# Altium schematic symbol library Analog Devices Data Converters Analog-to-Digital Converters.SchLib: 2404 symbols (part 177 of 213)
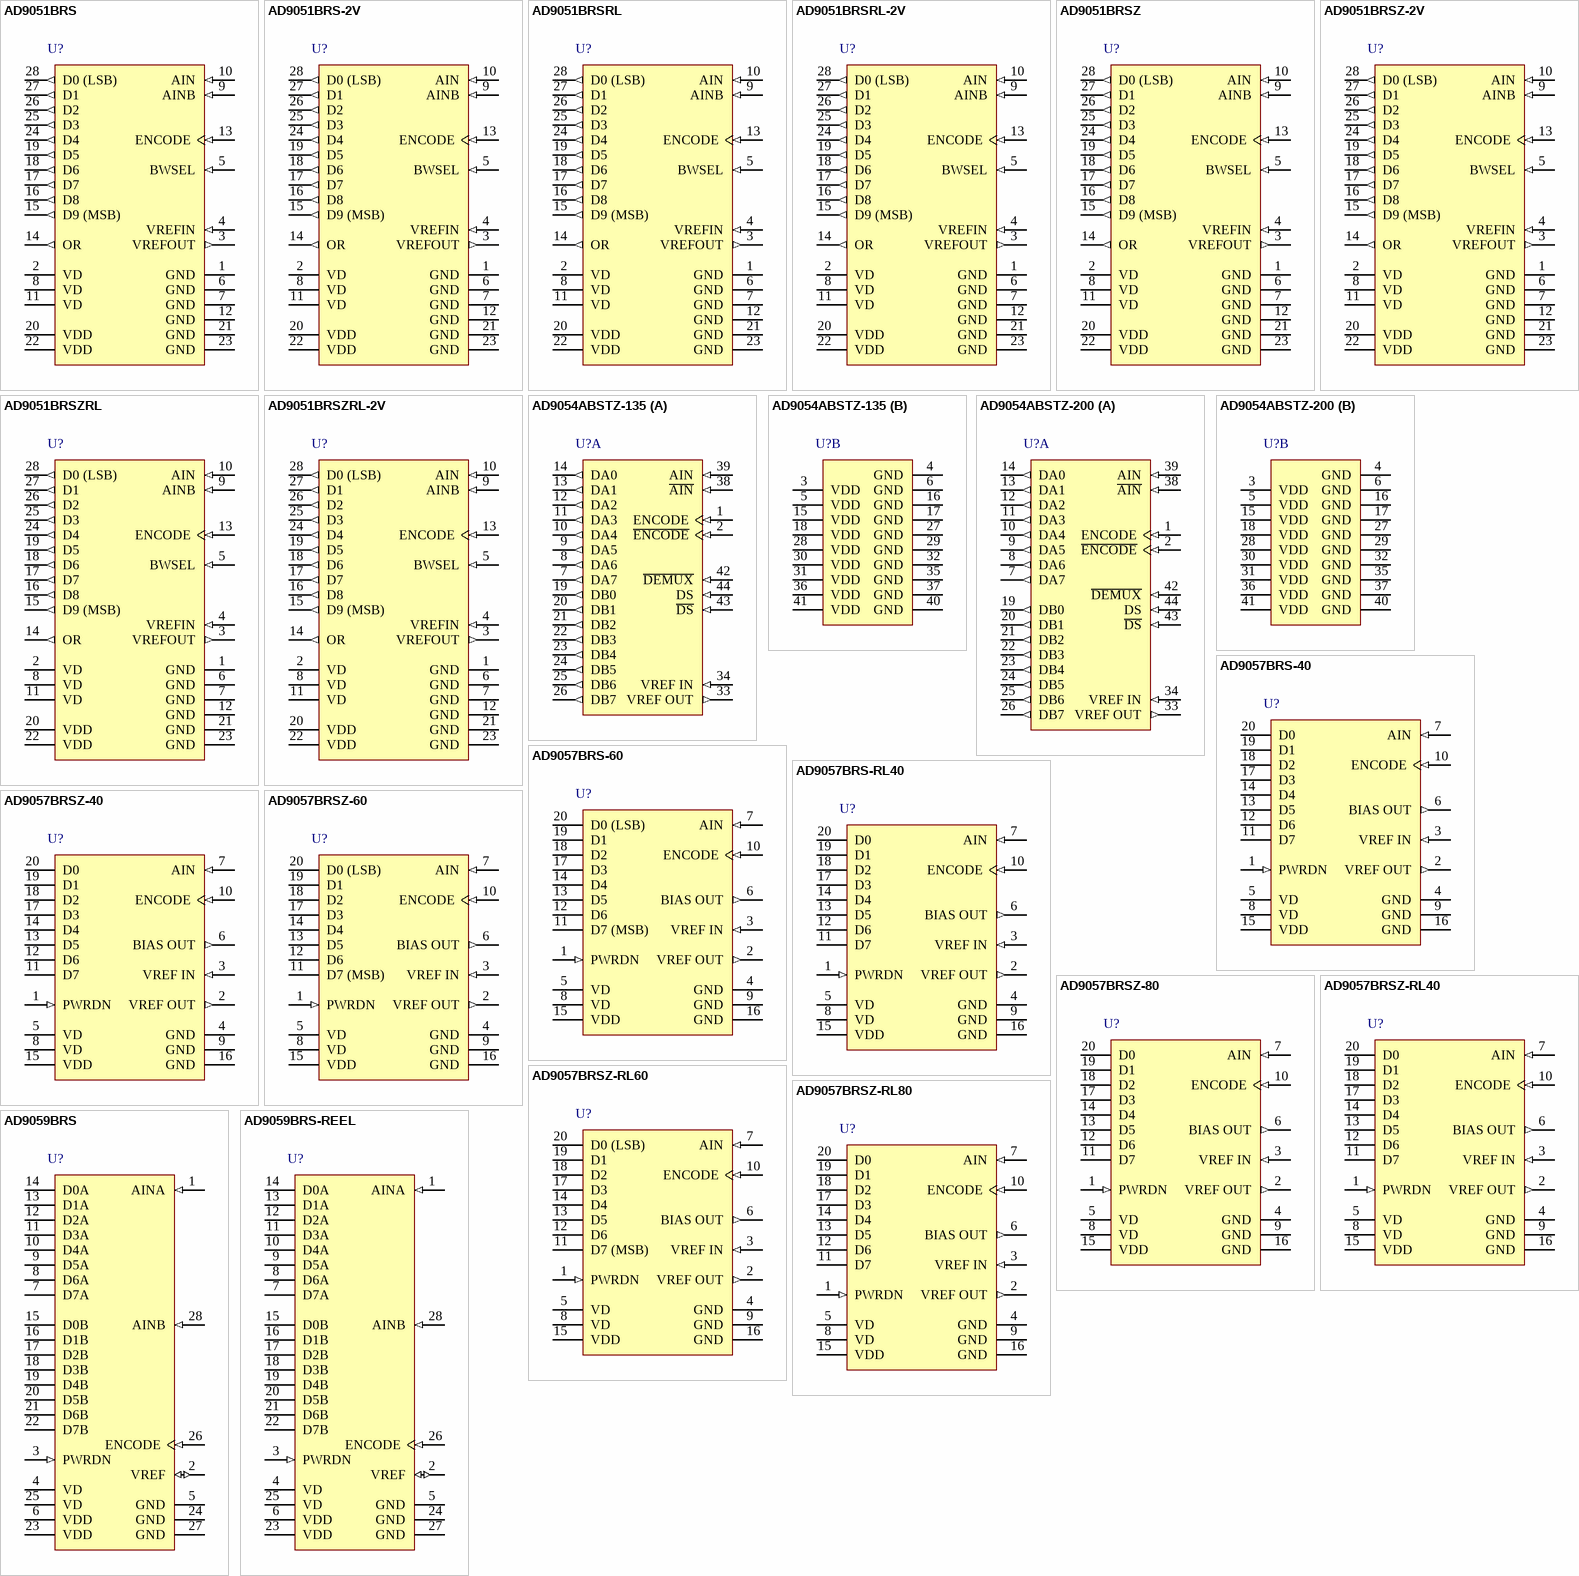
[diagram p332: symbols AD9051BRS to AD9059BRS-REEL]

## AD9051BRSZRL-2V
designator U?
Single 10-Bit Analog-to-Digital Converter with Parallel Interface, 60MSPS, -40 to +85 degC, RS-28, Pb-Free, Reel; Generic Part Number: AD9051; Manufacturer: Analog Devices; PartNumber: AD9051BRSZRL-2V; Resolution (Bits): 10; Channels: 1; Throughput Rate (SPS): 60M; Interface: Par; DatasheetVersion: Rev.C; PackageVersion: 060106-A; PackageReference: RS-28; PackageDescription: 28-Lead Shrink Small Outline Package [SSOP]; Supplier 1: Digi-Key; Supplier Part Number 1: AD9051BRSZRL-2V-ND; Supplier 2: Mouser; Supplier Part Number 2: 584-AD9051BRSZR-2V; RoHS: Y; Packing: Reel; Mounting Technology: Surface Mount; Code_JEDEC: MO-150-AH; ComponentLink1Description: Manufacturer URL; ComponentLink1URL: http://www.analog.com/en/index.html; ComponentLink2Description: Datasheet; ComponentLink2URL: http://www.analog.com/static/imported-files/data_sheets/AD9051.pdf; ComponentLink3Description: Package Specification; ComponentLink3URL: http://www.analog.com/static/imported-files/packages/32122249223724RS_28.pdf; ComponentLink4Description: Product URL; ComponentLink4URL: http://www.analog.com/en/analog-to-digital-converters/ad-converters/ad9051/products/product.html
footprint RS-28_N (SOP, 28-Leads, Body 10.2x5.3mm, Pitch 0.65mm, IPC Medium Density)
footprint RS-28_L (SOP, 28-Leads, Body 10.2x5.3mm, Pitch 0.65mm, IPC High Density)
footprint RS-28_M (SOP, 28-Leads, Body 10.2x5.3mm, Pitch 0.65mm, IPC Low Density)
pins: 1 GND (power) "Ground", 2 VD (power) "Analog 5 V Power Supply", 3 VREFOUT (out) "Internal Bandgap Voltage Reference (Nominally 2.5 V)", 4 VREFIN (in) "Input to Reference Amplifier. Voltage reference for ADC is connected here.", 5 BWSEL (in) "Bandwidth Select. NC = 130 MHz nominal. +VD = 50 MHz nominal.", 6 GND (power) "Ground", 7 GND (power) "Ground", 8 VD (power) "Analog 5 V Power Supply", 9 AINB (in) "Complementary Analog Input Pin (Analog Input Bar)", 10 AIN (in) "Analog Input Pin", 11 VD (power) "Analog 5 V Power Supply", 12 GND (power) "Ground", 13 ENCODE (in) "Encode Clock Input to ADC. Internal T/H is placed in hold mode (ADC is encoding) on rising edge of encode signal.", 14 OR (out) "Out of Range Signal. Logic 0 when analog input is in nominal range. Logic 1 when analog input is out of nominal range", 15 D9 (MSB) (out) "Most Significant Bit of ADC Output", 16 D8 (out) "Digital Output Bits of ADC", 17 D7 (out) "Digital Output Bits of ADC", 18 D6 (out) "Digital Output Bits of ADC", 19 D5 (out) "Digital Output Bits of ADC", 20 VDD (power) "Digital Output Power Supply (Only Used by Digital Outputs)", 21 GND (power) "Ground", 22 VDD (power) "Digital Output Power Supply (Only Used by Digital Outputs)", 23 GND (power) "Ground", 24 D4 (out) "Digital Output Bits of ADC", 25 D3 (out) "Digital Output Bits of ADC", 26 D2 (out) "Digital Output Bits of ADC", 27 D1 (out) "Digital Output Bits of ADC", 28 D0 (LSB) (out) "Least Significant Bit of ADC Output"

## AD9054ABSTZ-135
designator U?
Single 8-Bit Analog-to-Digital Converter with Parallel Interface, 135MSPS, -40 to +85 degC, ST-44-1, Pb-Free, Tray; Generic Part Number: AD9054A-135; Manufacturer: Analog Devices; PartNumber: AD9054ABSTZ-135; Resolution (Bits): 8; Channels: 1; Throughput Rate (SPS): 135M; Interface: Par; DatasheetVersion: Rev.D; PackageVersion: 051706-A; PackageReference: ST-44-1; PackageDescription: 44-Lead Low Profile Quad Flat Package [LQFP]; Supplier 1: Digi-Key; Supplier Part Number 1: AD9054ABSTZ-135-ND; Supplier 2: Mouser; Supplier Part Number 2: 584-AD9054ABSTZ-135; RoHS: Y; Packing: Tray; Mounting Technology: Surface Mount; ComponentLink1Description: Manufacturer URL; ComponentLink1URL: http://www.analog.com/en/index.html; ComponentLink2Description: Datasheet; ComponentLink2URL: http://www.analog.com/static/imported-files/data_sheets/AD9054A.pdf; ComponentLink3Description: Package Specification; ComponentLink3URL: http://www.analog.com/static/imported-files/packages/52366619645036ST_44_1.pdf; ComponentLink4Description: Product URL; ComponentLink4URL: http://www.analog.com/en/analog-to-digital-converters/ad-converters/ad9054a/products/product.html
footprint ST-44-1_N (Thin QFP, 44-Leads, Body 10x10mm, Pitch 0.8mm, IPC Medium Density)
footprint ST-44-1_L (Thin QFP, 44-Leads, Body 10x10mm, Pitch 0.8mm, IPC High Density)
footprint ST-44-1_M (Thin QFP, 44-Leads, Body 10x10mm, Pitch 0.8mm, IPC Low Density)
part A pins: 1 ENCODE (in) "Encode Clock for ADC (ADC Samples on Rising Edge of ENCODE)", 2 ~{ENCODE} (in) "Encode Clock Complement (ADC Samples on Falling Edge of E\N\C\O\D\E\)", 7 DA7 (out) "Digital Outputs of ADC Channel A. DA7 is the MSB, DA0 the LSB", 8 DA6 (out) "Digital Outputs of ADC Channel A. DA7 is the MSB, DA0 the LSB", 9 DA5 (out) "Digital Outputs of ADC Channel A. DA7 is the MSB, DA0 the LSB", 10 DA4 (out) "Digital Outputs of ADC Channel A. DA7 is the MSB, DA0 the LSB", 11 DA3 (out) "Digital Outputs of ADC Channel A. DA7 is the MSB, DA0 the LSB", 12 DA2 (out) "Digital Outputs of ADC Channel A. DA7 is the MSB, DA0 the LSB", 13 DA1 (out) "Digital Outputs of ADC Channel A. DA7 is the MSB, DA0 the LSB", 14 DA0 (out) "Digital Outputs of ADC Channel A. DA7 is the MSB, DA0 the LSB", 19 DB0 (out) "Digital Outputs of ADC Channel B. DB7 is the MSB, DB0 the LSB", 20 DB1 (out) "Digital Outputs of ADC Channel B. DB7 is the MSB, DB0 the LSB", 21 DB2 (out) "Digital Outputs of ADC Channel B. DB7 is the MSB, DB0 the LSB", 22 DB3 (out) "Digital Outputs of ADC Channel B. DB7 is the MSB, DB0 the LSB", 23 DB4 (out) "Digital Outputs of ADC Channel B. DB7 is the MSB, DB0 the LSB", 24 DB5 (out) "Digital Outputs of ADC Channel B. DB7 is the MSB, DB0 the LSB", 25 DB6 (out) "Digital Outputs of ADC Channel B. DB7 is the MSB, DB0 the LSB", 26 DB7 (out) "Digital Outputs of ADC Channel B. DB7 is the MSB, DB0 the LSB", 33 VREF OUT (out) "Internal Reference Output (2.5 V typical); Bypass with 0.1 uF to Ground", 34 VREF IN (in) "Reference Input for ADC (2.5 V typical, +/-4%)", 38 ~{AIN} (in) "Analog Input--Complement. Connect to input signal midscale reference.", 39 AIN (in) "Analog Input--True", 42 ~{DEMUX} (in) "Format Select. LOW = Dual. Channel Mode, HIGH = Single. Channel Mode (Channel A Only)", 43 ~{DS} (in) "Data Sync Complement", 44 DS (in) "Data Sync--Aligns Output Channels in Dual-Channel Mode"
part B pins: 3 VDD (power) "Power Supply (5 V)", 4 GND (power) "Ground", 5 VDD (power) "Power Supply (5 V)", 6 GND (power) "Ground", 15 VDD (power) "Power Supply (5 V)", 16 GND (power) "Ground", 17 GND (power) "Ground", 18 VDD (power) "Power Supply (5 V)", 27 GND (power) "Ground", 28 VDD (power) "Power Supply (5 V)", 29 GND (power) "Ground", 30 VDD (power) "Power Supply (5 V)", 31 VDD (power) "Power Supply (5 V)", 32 GND (power) "Ground", 35 GND (power) "Ground", 36 VDD (power) "Power Supply (5 V)", 37 GND (power) "Ground", 40 GND (power) "Ground", 41 VDD (power) "Power Supply (5 V)"

## AD9054ABSTZ-200
designator U?
Single 8-Bit Analog-to-Digital Converter with Parallel Interface, 200MSPS, -40 to +85 degC, ST-44-1, Pb-Free, Tray; Generic Part Number: AD9054A-200; Manufacturer: Analog Devices; PartNumber: AD9054ABSTZ-200; Resolution (Bits): 8; Channels: 1; Throughput Rate (SPS): 200M; Interface: Par; DatasheetVersion: Rev.D; PackageVersion: 051706-A; PackageReference: ST-44-1; PackageDescription: 44-Lead Low Profile Quad Flat Package [LQFP]; Supplier 1: Digi-Key; Supplier Part Number 1: AD9054ABSTZ-200-ND; Supplier 2: Newark; Supplier Part Number 2: 12M9172; Supplier 3: Mouser; Supplier Part Number 3: 584-AD9054ABSTZ-200; RoHS: Y; Packing: Tray; Mounting Technology: Surface Mount; ComponentLink1Description: Manufacturer URL; ComponentLink1URL: http://www.analog.com/en/index.html; ComponentLink2Description: Datasheet; ComponentLink2URL: http://www.analog.com/static/imported-files/data_sheets/AD9054A.pdf; ComponentLink3Description: Package Specification; ComponentLink3URL: http://www.analog.com/static/imported-files/packages/52366619645036ST_44_1.pdf; ComponentLink4Description: Product URL; ComponentLink4URL: http://www.analog.com/en/analog-to-digital-converters/ad-converters/ad9054a/products/product.html
footprint ST-44-1_N (Thin QFP, 44-Leads, Body 10x10mm, Pitch 0.8mm, IPC Medium Density)
footprint ST-44-1_L (Thin QFP, 44-Leads, Body 10x10mm, Pitch 0.8mm, IPC High Density)
footprint ST-44-1_M (Thin QFP, 44-Leads, Body 10x10mm, Pitch 0.8mm, IPC Low Density)
part A pins: 1 ENCODE (in) "Encode Clock for ADC (ADC Samples on Rising Edge of ENCODE)", 2 ~{ENCODE} (in) "Encode Clock Complement (ADC Samples on Falling Edge of E\N\C\O\D\E\)", 7 DA7 (out) "Digital Outputs of ADC Channel A. DA7 is the MSB.", 8 DA6 (out) "Digital Outputs of ADC Channel A.", 9 DA5 (out) "Digital Outputs of ADC Channel A.", 10 DA4 (out) "Digital Outputs of ADC Channel A.", 11 DA3 (out) "Digital Outputs of ADC Channel A.", 12 DA2 (out) "Digital Outputs of ADC Channel A.", 13 DA1 (out) "Digital Outputs of ADC Channel A.", 14 DA0 (out) "Digital Outputs of ADC Channel A. DA0 is the LSB.", 19 DB0 (out) "Digital Outputs of ADC Channel B. DB0 is the LSB", 20 DB1 (out) "Digital Outputs of ADC Channel B.", 21 DB2 (out) "Digital Outputs of ADC Channel B.", 22 DB3 (out) "Digital Outputs of ADC Channel B.", 23 DB4 (out) "Digital Outputs of ADC Channel B.", 24 DB5 (out) "Digital Outputs of ADC Channel B.", 25 DB6 (out) "Digital Outputs of ADC Channel B.", 26 DB7 (out) "Digital Outputs of ADC Channel B. DB7 is the MSB.", 33 VREF OUT (out) "Internal Reference Output (2.5 V typical); Bypass with 0.1 uF to Ground", 34 VREF IN (in) "Reference Input for ADC (2.5 V typical, +/-4%)", 38 ~{AIN} (in) "Analog Input--Complement. Connect to input signal midscale reference.", 39 AIN (in) "Analog Input--True", 42 ~{DEMUX} (in) "Format Select. LOW = Dual. Channel Mode, HIGH = Single. Channel Mode (Channel A Only)", 43 ~{DS} (in) "Data Sync Complement", 44 DS (in) "Data Sync--Aligns Output Channels in Dual-Channel Mode"
part B pins: 3 VDD (power) "Power Supply (5 V)", 4 GND (power) "Ground", 5 VDD (power) "Power Supply (5 V)", 6 GND (power) "Ground", 15 VDD (power) "Power Supply (5 V)", 16 GND (power) "Ground", 17 GND (power) "Ground", 18 VDD (power) "Power Supply (5 V)", 27 GND (power) "Ground", 28 VDD (power) "Power Supply (5 V)", 29 GND (power) "Ground", 30 VDD (power) "Power Supply (5 V)", 31 VDD (power) "Power Supply (5 V)", 32 GND (power) "Ground", 35 GND (power) "Ground", 36 VDD (power) "Power Supply (5 V)", 37 GND (power) "Ground", 40 GND (power) "Ground", 41 VDD (power) "Power Supply (5 V)"

## AD9057BRS-40
designator U?
Single 8-Bit Analog-to-Digital Converter with Parallel Interface, 40MSPS, 0 to +70 degC, RS-20, Tube; Generic Part Number: AD9057-40; Manufacturer: Analog Devices; PartNumber: AD9057BRS-40; Resolution (Bits): 8; Channels: 1; Throughput Rate (SPS): 40M; Interface: Par; DatasheetVersion: Rev.D; PackageVersion: Mar-2003; PackageReference: RS-20; PackageDescription: 20-Lead Shrink Small Outline Package [SSOP]; Supplier 1: Digi-Key; Supplier Part Number 1: AD9057BRS-40-ND; Supplier 2: Newark; Supplier Part Number 2: 16F7611; RoHS: N; Packing: Tube; Mounting Technology: Surface Mount; Code_JEDEC: MO-150AE; ComponentLink1Description: Manufacturer URL; ComponentLink1URL: http://www.analog.com/en/index.html; ComponentLink2Description: Datasheet; ComponentLink2URL: http://www.analog.com/static/imported-files/data_sheets/AD9057.pdf; ComponentLink3Description: Package Specification; ComponentLink3URL: http://www.analog.com/static/imported-files/packages/318405805657546556503576154334802686596RS_20.pdf; ComponentLink4Description: Product URL; ComponentLink4URL: http://www.analog.com/en/analog-to-digital-converters/ad-converters/ad9057/products/product.html
footprint RS-20_N (SOP, 20-Leads, Body 7.2x5.3mm, Pitch 0.65mm, IPC Medium Density)
footprint RS-20_L (SOP, 20-Leads, Body 7.2x5.3mm, Pitch 0.65mm, IPC High Density)
footprint RS-20_M (SOP, 20-Leads, Body 7.2x5.3mm, Pitch 0.65mm, IPC Low Density)
pins: 1 PWRDN (in) "Power-Down Function Select;Logic High for Power-Down Mode (Digital Outputs Go to High Impedance State).", 2 VREF OUT (out) "Internal Reference Output (2.5 V typ); Bypass with 0.1 uF to Ground.", 3 VREF IN (in) "Reference Input for ADC (2.5 V typ, +/-10%).", 4 GND (power) "Ground (Analog/Digital).", 5 VD (power) "Analog 5 V Power Supply.", 6 BIAS OUT (out) "Bias Pin for AC Coupling (1 kW to REF IN)", 7 AIN (in) "Analog Input for ADC.", 8 VD (power) "Analog 5 V Power Supply.", 9 GND (power) "Ground (Analog/Digital).", 10 ENCODE (in) "Encode Clock for ADC (ADC Samples on Rising Edge of Encode).", 11 D7 (hiz) "Digital Outputs of ADC.", 12 D6 (hiz) "Digital Outputs of ADC", 13 D5 (hiz) "Digital Outputs of ADC", 14 D4 (hiz) "Digital Outputs of ADC", 15 VDD (power) "Digital Output Power Supply; Nominally 3 V to 5 V.", 16 GND (power) "Ground (Analog/Digital).", 17 D3 (hiz) "Digital Outputs of ADC", 18 D2 (hiz) "Digital Outputs of ADC", 19 D1 (hiz) "Digital Outputs of ADC", 20 D0 (hiz) "Digital Outputs of ADC"

## AD9057BRS-60
designator U?
Single 8-Bit Analog-to-Digital Converter with Parallel Interface, 60MSPS, -40 to +85 degC, RS-20, Tube; Generic Part Number: AD9057-60; Manufacturer: Analog Devices; PartNumber: AD9057BRS-60; Resolution (Bits): 8; Channels: 1; Throughput Rate (SPS): 60M; Interface: Par; DatasheetVersion: Rev.D; PackageVersion: Mar-2003; PackageReference: RS-20; PackageDescription: 20-Lead Shrink Small Outline Package [SSOP]; Supplier 1: Digi-Key; Supplier Part Number 1: AD9057BRS-60-ND; Supplier 2: Newark; Supplier Part Number 2: 91F1808; RoHS: N; Packing: Tube; Mounting Technology: Surface Mount; Code_JEDEC: MO-150AE; ComponentLink1Description: Manufacturer URL; ComponentLink1URL: http://www.analog.com/en/index.html; ComponentLink2Description: Datasheet; ComponentLink2URL: http://www.analog.com/static/imported-files/data_sheets/AD9057.pdf; ComponentLink3Description: Package Specification; ComponentLink3URL: http://www.analog.com/static/imported-files/packages/318405805657546556503576154334802686596RS_20.pdf; ComponentLink4Description: Product URL; ComponentLink4URL: http://www.analog.com/en/analog-to-digital-converters/ad-converters/ad9057/products/product.html
footprint RS-20_N (SOP, 20-Leads, Body 7.2x5.3mm, Pitch 0.65mm, IPC Medium Density)
footprint RS-20_L (SOP, 20-Leads, Body 7.2x5.3mm, Pitch 0.65mm, IPC High Density)
footprint RS-20_M (SOP, 20-Leads, Body 7.2x5.3mm, Pitch 0.65mm, IPC Low Density)
pins: 1 PWRDN (in) "Power-Down Function Select;Logic High for Power-Down Mode (Digital Outputs Go to High Impedance State).", 2 VREF OUT (out) "Internal Reference Output (2.5 V typ); Bypass with 0.1 uF to Ground.", 3 VREF IN (in) "Reference Input for ADC (2.5 V typ, +/-10%).", 4 GND (power) "Ground (Analog/Digital).", 5 VD (power) "Analog 5 V Power Supply.", 6 BIAS OUT (out) "Bias Pin for AC Coupling (1 kW to REF IN).", 7 AIN (in) "Analog Input for ADC.", 8 VD (power) "Analog 5 V Power Supply", 9 GND (power) "Ground (Analog/Digital).", 10 ENCODE (in) "Encode Clock for ADC (ADC Samples on Rising Edge of Encode).", 11 D7 (MSB) (hiz) "Digital Outputs of ADC.", 12 D6 (hiz) "Digital Outputs of ADC.", 13 D5 (hiz) "Digital Outputs of ADC.", 14 D4 (hiz) "Digital Outputs of ADC.", 15 VDD (power) "Digital Output Power Supply;Nominally 3 V to 5 V.", 16 GND (power) "Ground (Analog/Digital).", 17 D3 (hiz) "Digital Outputs of ADC.", 18 D2 (hiz) "Digital Outputs of ADC.", 19 D1 (hiz) "Digital Outputs of ADC.", 20 D0 (LSB) (hiz) "Digital Outputs of ADC."

## AD9057BRS-RL40
designator U?
Single 8-Bit Analog-to-Digital Converter with Parallel Interface, 40MSPS, -40 to +85 degC, RS-20, Reel; Generic Part Number: AD9057-40; Manufacturer: Analog Devices; PartNumber: AD9057BRS-RL40; Resolution (Bits): 8; Channels: 1; Throughput Rate (SPS): 40M; Interface: Par; DatasheetVersion: Rev.D; PackageVersion: Mar-2003; PackageReference: RS-20; PackageDescription: 20-Lead Shrink Small Outline Package [SSOP]; Supplier 1: Digi-Key; Supplier Part Number 1: AD9057BRS-RL40-ND; RoHS: N; Packing: Reel; Mounting Technology: Surface Mount; Code_JEDEC: MO-150AE; ComponentLink1Description: Manufacturer URL; ComponentLink1URL: http://www.analog.com/en/index.html; ComponentLink2Description: Datasheet; ComponentLink2URL: http://www.analog.com/static/imported-files/data_sheets/AD9057.pdf; ComponentLink3Description: Package Specification; ComponentLink3URL: http://www.analog.com/static/imported-files/packages/318405805657546556503576154334802686596RS_20.pdf; ComponentLink4Description: Product URL; ComponentLink4URL: http://www.analog.com/en/analog-to-digital-converters/ad-converters/ad9057/products/product.html
footprint RS-20_N (SOP, 20-Leads, Body 7.2x5.3mm, Pitch 0.65mm, IPC Medium Density)
footprint RS-20_L (SOP, 20-Leads, Body 7.2x5.3mm, Pitch 0.65mm, IPC High Density)
footprint RS-20_M (SOP, 20-Leads, Body 7.2x5.3mm, Pitch 0.65mm, IPC Low Density)
pins: 1 PWRDN (in) "Power-Down Function Select;Logic High for Power-Down Mode (Digital Outputs Go to High Impedance State).", 2 VREF OUT (out) "Internal Reference Output (2.5 V typ); Bypass with 0.1 uF to Ground.", 3 VREF IN (in) "Reference Input for ADC (2.5 V typ, +/-10%).", 4 GND (power) "Ground (Analog/Digital).", 5 VD (power) "Analog 5 V Power Supply.", 6 BIAS OUT (out) "Bias Pin for AC Coupling (1 kW to REF IN)", 7 AIN (in) "Analog Input for ADC.", 8 VD (power) "Analog 5 V Power Supply.", 9 GND (power) "Ground (Analog/Digital).", 10 ENCODE (in) "Encode Clock for ADC (ADC Samples on Rising Edge of Encode).", 11 D7 (hiz) "Digital Outputs of ADC.", 12 D6 (hiz) "Digital Outputs of ADC", 13 D5 (hiz) "Digital Outputs of ADC", 14 D4 (hiz) "Digital Outputs of ADC", 15 VDD (power) "Digital Output Power Supply; Nominally 3 V to 5 V.", 16 GND (power) "Ground (Analog/Digital).", 17 D3 (hiz) "Digital Outputs of ADC", 18 D2 (hiz) "Digital Outputs of ADC", 19 D1 (hiz) "Digital Outputs of ADC", 20 D0 (hiz) "Digital Outputs of ADC"

## AD9057BRSZ-40
designator U?
Single 8-Bit Analog-to-Digital Converter with Parallel Interface, 40MSPS, -40 to +85 degC, RS-20, Pb-Free, Tube; Generic Part Number: AD9057-40; Manufacturer: Analog Devices; PartNumber: AD9057BRSZ-40; Resolution (Bits): 8; Channels: 1; Throughput Rate (SPS): 40M; Interface: Par; DatasheetVersion: Rev.D; PackageVersion: Mar-2003; PackageReference: RS-20; PackageDescription: 20-Lead Shrink Small Outline Package [SSOP]; Supplier 1: Digi-Key; Supplier Part Number 1: AD9057BRSZ-40-ND; Supplier 2: Mouser; Supplier Part Number 2: 584-AD9057BRSZ-40; RoHS: Y; Packing: Tube; Mounting Technology: Surface Mount; Code_JEDEC: MO-150AE; ComponentLink1Description: Manufacturer URL; ComponentLink1URL: http://www.analog.com/en/index.html; ComponentLink2Description: Datasheet; ComponentLink2URL: http://www.analog.com/static/imported-files/data_sheets/AD9057.pdf; ComponentLink3Description: Package Specification; ComponentLink3URL: http://www.analog.com/static/imported-files/packages/318405805657546556503576154334802686596RS_20.pdf; ComponentLink4Description: Product URL; ComponentLink4URL: http://www.analog.com/en/analog-to-digital-converters/ad-converters/ad9057/products/product.html
footprint RS-20_N (SOP, 20-Leads, Body 7.2x5.3mm, Pitch 0.65mm, IPC Medium Density)
footprint RS-20_L (SOP, 20-Leads, Body 7.2x5.3mm, Pitch 0.65mm, IPC High Density)
footprint RS-20_M (SOP, 20-Leads, Body 7.2x5.3mm, Pitch 0.65mm, IPC Low Density)
pins: 1 PWRDN (in) "Power-Down Function Select;Logic High for Power-Down Mode (Digital Outputs Go to High Impedance State).", 2 VREF OUT (out) "Internal Reference Output (2.5 V typ); Bypass with 0.1 uF to Ground.", 3 VREF IN (in) "Reference Input for ADC (2.5 V typ, +/-10%).", 4 GND (power) "Ground (Analog/Digital).", 5 VD (power) "Analog 5 V Power Supply.", 6 BIAS OUT (out) "Bias Pin for AC Coupling (1 kW to REF IN)", 7 AIN (in) "Analog Input for ADC.", 8 VD (power) "Analog 5 V Power Supply.", 9 GND (power) "Ground (Analog/Digital).", 10 ENCODE (in) "Encode Clock for ADC (ADC Samples on Rising Edge of Encode).", 11 D7 (hiz) "Digital Outputs of ADC.", 12 D6 (hiz) "Digital Outputs of ADC", 13 D5 (hiz) "Digital Outputs of ADC", 14 D4 (hiz) "Digital Outputs of ADC", 15 VDD (power) "Digital Output Power Supply; Nominally 3 V to 5 V.", 16 GND (power) "Ground (Analog/Digital).", 17 D3 (hiz) "Digital Outputs of ADC", 18 D2 (hiz) "Digital Outputs of ADC", 19 D1 (hiz) "Digital Outputs of ADC", 20 D0 (hiz) "Digital Outputs of ADC"

## AD9057BRSZ-60
designator U?
Single 8-Bit Analog-to-Digital Converter with Parallel Interface, 60MSPS, -40 to +85 degC, RS-20, Pb-Free, Tube; Generic Part Number: AD9057-60; Manufacturer: Analog Devices; PartNumber: AD9057BRSZ-60; Resolution (Bits): 8; Channels: 1; Throughput Rate (SPS): 60M; Interface: Par; DatasheetVersion: Rev.D; PackageVersion: Mar-2003; PackageReference: RS-20; PackageDescription: 20-Lead Shrink Small Outline Package [SSOP]; Supplier 1: Digi-Key; Supplier Part Number 1: AD9057BRSZ-60-ND; Supplier 2: Mouser; Supplier Part Number 2: 584-AD9057BRSZ-60; RoHS: Y; Packing: Tube; Mounting Technology: Surface Mount; Code_JEDEC: MO-150AE; ComponentLink1Description: Manufacturer URL; ComponentLink1URL: http://www.analog.com/en/index.html; ComponentLink2Description: Datasheet; ComponentLink2URL: http://www.analog.com/static/imported-files/data_sheets/AD9057.pdf; ComponentLink3Description: Package Specification; ComponentLink3URL: http://www.analog.com/static/imported-files/packages/318405805657546556503576154334802686596RS_20.pdf; ComponentLink4Description: Product URL; ComponentLink4URL: http://www.analog.com/en/analog-to-digital-converters/ad-converters/ad9057/products/product.html
footprint RS-20_N (SOP, 20-Leads, Body 7.2x5.3mm, Pitch 0.65mm, IPC Medium Density)
footprint RS-20_L (SOP, 20-Leads, Body 7.2x5.3mm, Pitch 0.65mm, IPC High Density)
footprint RS-20_M (SOP, 20-Leads, Body 7.2x5.3mm, Pitch 0.65mm, IPC Low Density)
pins: 1 PWRDN (in) "Power-Down Function Select;Logic High for Power-Down Mode (Digital Outputs Go to High Impedance State).", 2 VREF OUT (out) "Internal Reference Output (2.5 V typ); Bypass with 0.1 uF to Ground.", 3 VREF IN (in) "Reference Input for ADC (2.5 V typ, +/-10%).", 4 GND (power) "Ground (Analog/Digital).", 5 VD (power) "Analog 5 V Power Supply.", 6 BIAS OUT (out) "Bias Pin for AC Coupling (1 kW to REF IN).", 7 AIN (in) "Analog Input for ADC.", 8 VD (power) "Analog 5 V Power Supply", 9 GND (power) "Ground (Analog/Digital).", 10 ENCODE (in) "Encode Clock for ADC (ADC Samples on Rising Edge of Encode).", 11 D7 (MSB) (hiz) "Digital Outputs of ADC.", 12 D6 (hiz) "Digital Outputs of ADC.", 13 D5 (hiz) "Digital Outputs of ADC.", 14 D4 (hiz) "Digital Outputs of ADC.", 15 VDD (power) "Digital Output Power Supply;Nominally 3 V to 5 V.", 16 GND (power) "Ground (Analog/Digital).", 17 D3 (hiz) "Digital Outputs of ADC.", 18 D2 (hiz) "Digital Outputs of ADC.", 19 D1 (hiz) "Digital Outputs of ADC.", 20 D0 (LSB) (hiz) "Digital Outputs of ADC."

## AD9057BRSZ-80
designator U?
Single 8-Bit Analog-to-Digital Converter with Parallel Interface, 80MSPS, -40 to +85 degC, RS-20, Pb-Free, Tube; Generic Part Number: AD9057-80; Manufacturer: Analog Devices; PartNumber: AD9057BRSZ-80; Resolution (Bits): 8; Channels: 1; Throughput Rate (SPS): 80M; Interface: Par; DatasheetVersion: Rev.D; PackageVersion: Mar-2003; PackageReference: RS-20; PackageDescription: 20-Lead Shrink Small Outline Package [SSOP]; Supplier 1: Digi-Key; Supplier Part Number 1: AD9057BRSZ-80-ND; Supplier 2: Newark; Supplier Part Number 2: 88H0317; Supplier 3: Mouser; Supplier Part Number 3: 584-AD9057BRSZ-80; RoHS: Y; Packing: Tube; Mounting Technology: Surface Mount; Code_JEDEC: MO-150AE; ComponentLink1Description: Manufacturer URL; ComponentLink1URL: http://www.analog.com/en/index.html; ComponentLink2Description: Datasheet; ComponentLink2URL: http://www.analog.com/static/imported-files/data_sheets/AD9057.pdf; ComponentLink3Description: Package Specification; ComponentLink3URL: http://www.analog.com/static/imported-files/packages/318405805657546556503576154334802686596RS_20.pdf; ComponentLink4Description: Product URL; ComponentLink4URL: http://www.analog.com/en/analog-to-digital-converters/ad-converters/ad9057/products/product.html
footprint RS-20_N (SOP, 20-Leads, Body 7.2x5.3mm, Pitch 0.65mm, IPC Medium Density)
footprint RS-20_L (SOP, 20-Leads, Body 7.2x5.3mm, Pitch 0.65mm, IPC High Density)
footprint RS-20_M (SOP, 20-Leads, Body 7.2x5.3mm, Pitch 0.65mm, IPC Low Density)
pins: 1 PWRDN (in) "Power-Down Function Select;Logic High for Power-DownMode (Digital Outputs Go toHigh Impedance State).", 2 VREF OUT (out) "Internal Reference Output(2.5 V typ); Bypass with 0.1 uFto Ground.", 3 VREF IN (in) "Reference Input for ADC (2.5 Vtyp, +/-10%).", 4 GND (power) "Ground (Analog/Digital).", 5 VD (power) "Analog 5 V Power Supply.", 6 BIAS OUT (out) "Bias Pin for AC Coupling (1 k ohm to REF IN).", 7 AIN (in) "Analog Input for ADC.", 8 VD (power) "Analog 5 V Power Supply.", 9 GND (power) "Ground (Analog/Digital).", 10 ENCODE (in) "Encode Clock for ADC (ADCS amples on Rising Edge of Encode).", 11 D7 (hiz) "Digital Outputs of ADC.", 12 D6 (hiz) "Digital Outputs of ADC.", 13 D5 (hiz) "Digital Outputs of ADC.", 14 D4 (hiz) "Digital Outputs of ADC.", 15 VDD (power) "Digital Output Power Supply; Nominally 3 V to 5 V.", 16 GND (power) "Ground (Analog/Digital).", 17 D3 (hiz) "Digital Outputs of ADC.", 18 D2 (hiz) "Digital Outputs of ADC.", 19 D1 (hiz) "Digital Outputs of ADC.", 20 D0 (hiz) "Digital Outputs of ADC."

## AD9057BRSZ-RL40
designator U?
Single 8-Bit Analog-to-Digital Converter with Parallel Interface, 40MSPS, -40 to +85 degC, RS-20, Pb-Free, Reel; Generic Part Number: AD9057-40; Manufacturer: Analog Devices; PartNumber: AD9057BRSZ-RL40; Resolution (Bits): 8; Channels: 1; Throughput Rate (SPS): 40M; Interface: Par; DatasheetVersion: Rev.D; PackageVersion: Mar-2003; PackageReference: RS-20; PackageDescription: 20-Lead Shrink Small Outline Package [SSOP]; Supplier 1: Digi-Key; Supplier Part Number 1: AD9057BRSZ-RL40-ND; Supplier 2: Mouser; Supplier Part Number 2: 584-AD9057BRSZ-R40; RoHS: Y; Packing: Reel; Mounting Technology: Surface Mount; Code_JEDEC: MO-150AE; ComponentLink1Description: Manufacturer URL; ComponentLink1URL: http://www.analog.com/en/index.html; ComponentLink2Description: Datasheet; ComponentLink2URL: http://www.analog.com/static/imported-files/data_sheets/AD9057.pdf; ComponentLink3Description: Package Specification; ComponentLink3URL: http://www.analog.com/static/imported-files/packages/318405805657546556503576154334802686596RS_20.pdf; ComponentLink4Description: Product URL; ComponentLink4URL: http://www.analog.com/en/analog-to-digital-converters/ad-converters/ad9057/products/product.html
footprint RS-20_N (SOP, 20-Leads, Body 7.2x5.3mm, Pitch 0.65mm, IPC Medium Density)
footprint RS-20_L (SOP, 20-Leads, Body 7.2x5.3mm, Pitch 0.65mm, IPC High Density)
footprint RS-20_M (SOP, 20-Leads, Body 7.2x5.3mm, Pitch 0.65mm, IPC Low Density)
pins: 1 PWRDN (in) "Power-Down Function Select;Logic High for Power-Down Mode (Digital Outputs Go to High Impedance State).", 2 VREF OUT (out) "Internal Reference Output (2.5 V typ); Bypass with 0.1 uF to Ground.", 3 VREF IN (in) "Reference Input for ADC (2.5 V typ, +/-10%).", 4 GND (power) "Ground (Analog/Digital).", 5 VD (power) "Analog 5 V Power Supply.", 6 BIAS OUT (out) "Bias Pin for AC Coupling (1 kW to REF IN)", 7 AIN (in) "Analog Input for ADC.", 8 VD (power) "Analog 5 V Power Supply.", 9 GND (power) "Ground (Analog/Digital).", 10 ENCODE (in) "Encode Clock for ADC (ADC Samples on Rising Edge of Encode).", 11 D7 (hiz) "Digital Outputs of ADC.", 12 D6 (hiz) "Digital Outputs of ADC", 13 D5 (hiz) "Digital Outputs of ADC", 14 D4 (hiz) "Digital Outputs of ADC", 15 VDD (power) "Digital Output Power Supply; Nominally 3 V to 5 V.", 16 GND (power) "Ground (Analog/Digital).", 17 D3 (hiz) "Digital Outputs of ADC", 18 D2 (hiz) "Digital Outputs of ADC", 19 D1 (hiz) "Digital Outputs of ADC", 20 D0 (hiz) "Digital Outputs of ADC"

## AD9057BRSZ-RL60
designator U?
Single 8-Bit Analog-to-Digital Converter with Parallel Interface, 60MSPS, -40 to +85 degC, RS-20, Pb-Free, Reel; Generic Part Number: AD9057-60; Manufacturer: Analog Devices; PartNumber: AD9057BRSZ-RL60; Resolution (Bits): 8; Channels: 1; Throughput Rate (SPS): 60M; Interface: Par; DatasheetVersion: Rev.D; PackageVersion: Mar-2003; PackageReference: RS-20; PackageDescription: 20-Lead Shrink Small Outline Package [SSOP]; Supplier 1: Digi-Key; Supplier Part Number 1: AD9057BRSZ-RL60-ND; Supplier 2: Mouser; Supplier Part Number 2: 584-AD9057BRSZ-R60; RoHS: Y; Packing: Reel; Mounting Technology: Surface Mount; Code_JEDEC: MO-150AE; ComponentLink1Description: Manufacturer URL; ComponentLink1URL: http://www.analog.com/en/index.html; ComponentLink2Description: Datasheet; ComponentLink2URL: http://www.analog.com/static/imported-files/data_sheets/AD9057.pdf; ComponentLink3Description: Package Specification; ComponentLink3URL: http://www.analog.com/static/imported-files/packages/318405805657546556503576154334802686596RS_20.pdf; ComponentLink4Description: Product URL; ComponentLink4URL: http://www.analog.com/en/analog-to-digital-converters/ad-converters/ad9057/products/product.html
footprint RS-20_N (SOP, 20-Leads, Body 7.2x5.3mm, Pitch 0.65mm, IPC Medium Density)
footprint RS-20_L (SOP, 20-Leads, Body 7.2x5.3mm, Pitch 0.65mm, IPC High Density)
footprint RS-20_M (SOP, 20-Leads, Body 7.2x5.3mm, Pitch 0.65mm, IPC Low Density)
pins: 1 PWRDN (in) "Power-Down Function Select;Logic High for Power-Down Mode (Digital Outputs Go to High Impedance State).", 2 VREF OUT (out) "Internal Reference Output (2.5 V typ); Bypass with 0.1 uF to Ground.", 3 VREF IN (in) "Reference Input for ADC (2.5 V typ, +/-10%).", 4 GND (power) "Ground (Analog/Digital).", 5 VD (power) "Analog 5 V Power Supply.", 6 BIAS OUT (out) "Bias Pin for AC Coupling (1 kW to REF IN).", 7 AIN (in) "Analog Input for ADC.", 8 VD (power) "Analog 5 V Power Supply", 9 GND (power) "Ground (Analog/Digital).", 10 ENCODE (in) "Encode Clock for ADC (ADC Samples on Rising Edge of Encode).", 11 D7 (MSB) (hiz) "Digital Outputs of ADC.", 12 D6 (hiz) "Digital Outputs of ADC.", 13 D5 (hiz) "Digital Outputs of ADC.", 14 D4 (hiz) "Digital Outputs of ADC.", 15 VDD (power) "Digital Output Power Supply;Nominally 3 V to 5 V.", 16 GND (power) "Ground (Analog/Digital).", 17 D3 (hiz) "Digital Outputs of ADC.", 18 D2 (hiz) "Digital Outputs of ADC.", 19 D1 (hiz) "Digital Outputs of ADC.", 20 D0 (LSB) (hiz) "Digital Outputs of ADC."

## AD9057BRSZ-RL80
designator U?
Single 8-Bit Analog-to-Digital Converter with Parallel Interface, 80MSPS, -40 to +85 degC, RS-20, Pb-Free, Reel; Generic Part Number: AD9057-80; Manufacturer: Analog Devices; PartNumber: AD9057BRSZ-RL80; Resolution (Bits): 8; Channels: 1; Throughput Rate (SPS): 80M; Interface: Par; DatasheetVersion: Rev.D; PackageVersion: Mar-2003; PackageReference: RS-20; PackageDescription: 20-Lead Shrink Small Outline Package [SSOP]; Supplier 1: Digi-Key; Supplier Part Number 1: AD9057BRSZ-RL80-ND; Supplier 2: Mouser; Supplier Part Number 2: 584-AD9057BRSZ-R80; RoHS: Y; Packing: Reel; Mounting Technology: Surface Mount; Code_JEDEC: MO-150AE; ComponentLink1Description: Manufacturer URL; ComponentLink1URL: http://www.analog.com/en/index.html; ComponentLink2Description: Datasheet; ComponentLink2URL: http://www.analog.com/static/imported-files/data_sheets/AD9057.pdf; ComponentLink3Description: Package Specification; ComponentLink3URL: http://www.analog.com/static/imported-files/packages/318405805657546556503576154334802686596RS_20.pdf; ComponentLink4Description: Product URL; ComponentLink4URL: http://www.analog.com/en/analog-to-digital-converters/ad-converters/ad9057/products/product.html
footprint RS-20_N (SOP, 20-Leads, Body 7.2x5.3mm, Pitch 0.65mm, IPC Medium Density)
footprint RS-20_L (SOP, 20-Leads, Body 7.2x5.3mm, Pitch 0.65mm, IPC High Density)
footprint RS-20_M (SOP, 20-Leads, Body 7.2x5.3mm, Pitch 0.65mm, IPC Low Density)
pins: 1 PWRDN (in) "Power-Down Function Select;Logic High for Power-DownMode (Digital Outputs Go toHigh Impedance State).", 2 VREF OUT (out) "Internal Reference Output(2.5 V typ); Bypass with 0.1 uFto Ground.", 3 VREF IN (in) "Reference Input for ADC (2.5 Vtyp, +/-10%).", 4 GND (power) "Ground (Analog/Digital).", 5 VD (power) "Analog 5 V Power Supply.", 6 BIAS OUT (out) "Bias Pin for AC Coupling (1 k ohm to REF IN).", 7 AIN (in) "Analog Input for ADC.", 8 VD (power) "Analog 5 V Power Supply.", 9 GND (power) "Ground (Analog/Digital).", 10 ENCODE (in) "Encode Clock for ADC (ADCS amples on Rising Edge of Encode).", 11 D7 (hiz) "Digital Outputs of ADC.", 12 D6 (hiz) "Digital Outputs of ADC.", 13 D5 (hiz) "Digital Outputs of ADC.", 14 D4 (hiz) "Digital Outputs of ADC.", 15 VDD (power) "Digital Output Power Supply; Nominally 3 V to 5 V.", 16 GND (power) "Ground (Analog/Digital).", 17 D3 (hiz) "Digital Outputs of ADC.", 18 D2 (hiz) "Digital Outputs of ADC.", 19 D1 (hiz) "Digital Outputs of ADC.", 20 D0 (hiz) "Digital Outputs of ADC."

## AD9059BRS
designator U?
Dual 8-Bit Analog-to-Digital Converter with Parallel Interface, 60MSPS, -40 to +85 degC, RS-28, Tube; Generic Part Number: AD9059; Manufacturer: Analog Devices; PartNumber: AD9059BRS; Resolution (Bits): 8; Channels: 2; Throughput Rate (SPS): 60M; Interface: Par; DatasheetVersion: Rev.A; PackageVersion: 060106-A; PackageReference: RS-28; PackageDescription: 28-Lead Shrink Small Outline Package [SSOP]; Supplier 1: Digi-Key; Supplier Part Number 1: AD9059BRS-ND; Supplier 2: Mouser; Supplier Part Number 2: 584-AD9059BRS; RoHS: N; Packing: Tube; Mounting Technology: Surface Mount; Code_JEDEC: MO-150-AH; ComponentLink1Description: Manufacturer URL; ComponentLink1URL: http://www.analog.com/en/index.html; ComponentLink2Description: Datasheet; ComponentLink2URL: http://www.analog.com/static/imported-files/data_sheets/AD9059.pdf; ComponentLink3Description: Package Specification; ComponentLink3URL: http://www.analog.com/static/imported-files/packages/32122249223724RS_28.pdf; ComponentLink4Description: Product URL; ComponentLink4URL: http://www.analog.com/en/analog-to-digital-converters/ad-converters/ad9059/products/product.html
footprint RS-28_N (SOP, 28-Leads, Body 10.2x5.3mm, Pitch 0.65mm, IPC Medium Density)
footprint RS-28_L (SOP, 28-Leads, Body 10.2x5.3mm, Pitch 0.65mm, IPC High Density)
footprint RS-28_M (SOP, 28-Leads, Body 10.2x5.3mm, Pitch 0.65mm, IPC Low Density)
pins: 1 AINA (in) "Analog Inputs for ADC A and B.", 2 VREF (io) "Internal Voltage Reference (2.5 V Typical); Bypass with 0.1 uF to Ground or Overdrive with External Voltage Reference.", 3 PWRDN (in) "Power-Down Function Select; Logic HIGH for Power-Down Mode (Digital Outputs Go to High-Impedance State).", 4 VD (power) "Analog 5 V Power Supply.", 5 GND (power) "Ground.", 6 VDD (power) "Digital Output Power Supply.Nominally 3 V to 5 V.", 7 D7A (hiz) "Digital Outputs of ADC A.", 8 D6A (hiz) "Digital Outputs of ADC A.", 9 D5A (hiz) "Digital Outputs of ADC A.", 10 D4A (hiz) "Digital Outputs of ADC A.", 11 D3A (hiz) "Digital Outputs of ADC A.", 12 D2A (hiz) "Digital Outputs of ADC A.", 13 D1A (hiz) "Digital Outputs of ADC A.", 14 D0A (hiz) "Digital Outputs of ADC A.", 15 D0B (hiz) "Digital Outputs of ADC B.", 16 D1B (hiz) "Digital Outputs of ADC B.", 17 D2B (hiz) "Digital Outputs of ADC B.", 18 D3B (hiz) "Digital Outputs of ADC B.", 19 D4B (hiz) "Digital Outputs of ADC B.", 20 D5B (hiz) "Digital Outputs of ADC B.", 21 D6B (hiz) "Digital Outputs of ADC B.", 22 D7B (hiz) "Digital Outputs of ADC B.", 23 VDD (power) "Digital Output Power Supply.Nominally 3 V to 5 V.", 24 GND (power) "Ground.", 25 VD (power) "Analog 5 V Power Supply.", 26 ENCODE (in) "Encode Clock for ADCs A and B (ADCs Sample Simultaneously on the Rising Edge of ENCODE).", 27 GND (power) "Ground.", 28 AINB (in) "Analog Inputs for ADC A and B."